# Altium schematic symbol library jlcpcb_2025_04_ferrites_extended_0603.schlib: 833 symbols (part 4 of 4) (continued)
## PB1608-600_3A0
designator FB?  Impedance @ Frequency: 60Ω@100MHz
Ferrite, 60Ω@100MHz, ±25%, 30mΩ, 3A, SMD 0603; Manufacturer: CEC(Shenzhen Zhenhua Fu Elec); Manufacturer Part Number: PB1608-600/3A0; Package Size: 0603; JLCPCB Basic Part: No; JLCPCB Part Number: C2983011; Supplier 1: LCSC; Category: Ferrite Beads; Supplier Part Number 1: C2983011; Tolerance: ±25%; Rated Current: 3A; DC Resistance: 30mΩ; RoHS: Yes; ComponentLink1Description: Datasheet; ComponentLink1URL: https://wmsc.lcsc.com/wmsc/upload/file/pdf/v2/lcsc/2203221830_CEC-Shenzhen-Zhenhua-Fu-Elec-PB1608-600-3A0_C2983011.pdf; ComponentLink2Description: JLCPCB Part URL; ComponentLink2URL: https://jlcpcb.com/partdetail/C2983011; ComponentLink3Description: LCSC Part URL; ComponentLink3URL: https://lcsc.com/product-detail/Ferrite-Beads_CECShenzhen-Zhenhua-Fu-Elec-CECShenzhen-Zhenhua-Fu-Elec-PB1608-600-3A0_C2983011.html
footprint FB-0603 (0603 (1608M) Ferrite)
pins: 1, 2

## PBY160808T-100Y-N
designator FB?  Impedance @ Frequency: 10Ω@100MHz
Ferrite, 10Ω@100MHz, ±25%, 0.02Ω, 4000mA, SMD 0603; Manufacturer: Chilisin Elec; Manufacturer Part Number: PBY160808T-100Y-N; Package Size: 0603; JLCPCB Basic Part: No; JLCPCB Part Number: C142081; Supplier 1: LCSC; Category: Ferrite Beads; Supplier Part Number 1: C142081; Tolerance: ±25%; Rated Current: 4000mA; DC Resistance: 0.02Ω; RoHS: Yes; ComponentLink1Description: Datasheet; ComponentLink1URL: https://wmsc.lcsc.com/wmsc/upload/file/pdf/v2/lcsc/2304140030_Chilisin-Elec-PBY160808T-100Y-N_C142081.pdf; ComponentLink2Description: JLCPCB Part URL; ComponentLink2URL: https://jlcpcb.com/partdetail/C142081; ComponentLink3Description: LCSC Part URL; ComponentLink3URL: https://lcsc.com/product-detail/Ferrite-Beads_Chilisin-Elec-Chilisin-Elec-PBY160808T-100Y-N_C142081.html
footprint FB-0603 (0603 (1608M) Ferrite)
pins: 1, 2

## PBY160808T-101Y-N
designator FB?  Impedance @ Frequency: 100Ω@100MHz
Ferrite, 100Ω@100MHz, ±25%, 0.05Ω, 2500mA, SMD 0603; Manufacturer: Chilisin Elec; Manufacturer Part Number: PBY160808T-101Y-N; Package Size: 0603; JLCPCB Basic Part: No; JLCPCB Part Number: C142080; Supplier 1: LCSC; Category: Ferrite Beads; Supplier Part Number 1: C142080; Tolerance: ±25%; Rated Current: 2500mA; DC Resistance: 0.05Ω; RoHS: Yes; ComponentLink1Description: Datasheet; ComponentLink1URL: https://wmsc.lcsc.com/wmsc/upload/file/pdf/v2/lcsc/2304140030_Chilisin-Elec-PBY160808T-101Y-N_C142080.pdf; ComponentLink2Description: JLCPCB Part URL; ComponentLink2URL: https://jlcpcb.com/partdetail/C142080; ComponentLink3Description: LCSC Part URL; ComponentLink3URL: https://lcsc.com/product-detail/Ferrite-Beads_Chilisin-Elec-Chilisin-Elec-PBY160808T-101Y-N_C142080.html
footprint FB-0603 (0603 (1608M) Ferrite)
pins: 1, 2

## PBY160808T-102Y-N
designator FB?  Impedance @ Frequency: 1000Ω@100MHz
Ferrite, 1000Ω@100MHz, ±25%, 0.25Ω, 800mA, SMD 0603; Manufacturer: Chilisin Elec; Manufacturer Part Number: PBY160808T-102Y-N; Package Size: 0603; JLCPCB Basic Part: No; JLCPCB Part Number: C142079; Supplier 1: LCSC; Category: Ferrite Beads; Supplier Part Number 1: C142079; Tolerance: ±25%; Rated Current: 800mA; DC Resistance: 0.25Ω; RoHS: Yes; ComponentLink1Description: Datasheet; ComponentLink1URL: https://wmsc.lcsc.com/wmsc/upload/file/pdf/v2/lcsc/2304140030_Chilisin-Elec-PBY160808T-102Y-N_C142079.pdf; ComponentLink2Description: JLCPCB Part URL; ComponentLink2URL: https://jlcpcb.com/partdetail/C142079; ComponentLink3Description: LCSC Part URL; ComponentLink3URL: https://lcsc.com/product-detail/Ferrite-Beads_Chilisin-Elec-Chilisin-Elec-PBY160808T-102Y-N_C142079.html
footprint FB-0603 (0603 (1608M) Ferrite)
pins: 1, 2

## PBY160808T-110Y-N
designator FB?  Impedance @ Frequency: 11Ω@100MHz
Ferrite, 11Ω@100MHz, ±25%, 0.02Ω, 4000mA, SMD 0603; Manufacturer: Chilisin Elec; Manufacturer Part Number: PBY160808T-110Y-N; Package Size: 0603; JLCPCB Basic Part: No; JLCPCB Part Number: C280672; Supplier 1: LCSC; Category: Ferrite Beads; Supplier Part Number 1: C280672; Tolerance: ±25%; Rated Current: 4000mA; DC Resistance: 0.02Ω; RoHS: Yes; ComponentLink1Description: Datasheet; ComponentLink1URL: https://wmsc.lcsc.com/wmsc/upload/file/pdf/v2/lcsc/2304140030_Chilisin-Elec-PBY160808T-110Y-N_C280672.pdf; ComponentLink2Description: JLCPCB Part URL; ComponentLink2URL: https://jlcpcb.com/partdetail/C280672; ComponentLink3Description: LCSC Part URL; ComponentLink3URL: https://lcsc.com/product-detail/Ferrite-Beads_Chilisin-Elec-Chilisin-Elec-PBY160808T-110Y-N_C280672.html
footprint FB-0603 (0603 (1608M) Ferrite)
pins: 1, 2

## PBY160808T-151Y-N
designator FB?  Impedance @ Frequency: 150Ω@100MHz
Ferrite, 150Ω@100MHz, ±25%, 0.085Ω, 2000mA, SMD 0603; Manufacturer: Chilisin Elec; Manufacturer Part Number: PBY160808T-151Y-N; Package Size: 0603; JLCPCB Basic Part: No; JLCPCB Part Number: C142078; Supplier 1: LCSC; Category: Ferrite Beads; Supplier Part Number 1: C142078; Tolerance: ±25%; Rated Current: 2000mA; DC Resistance: 0.085Ω; RoHS: Yes; ComponentLink1Description: Datasheet; ComponentLink1URL: https://wmsc.lcsc.com/wmsc/upload/file/pdf/v2/lcsc/2304140030_Chilisin-Elec-PBY160808T-151Y-N_C142078.pdf; ComponentLink2Description: JLCPCB Part URL; ComponentLink2URL: https://jlcpcb.com/partdetail/C142078; ComponentLink3Description: LCSC Part URL; ComponentLink3URL: https://lcsc.com/product-detail/Ferrite-Beads_Chilisin-Elec-Chilisin-Elec-PBY160808T-151Y-N_C142078.html
footprint FB-0603 (0603 (1608M) Ferrite)
pins: 1, 2

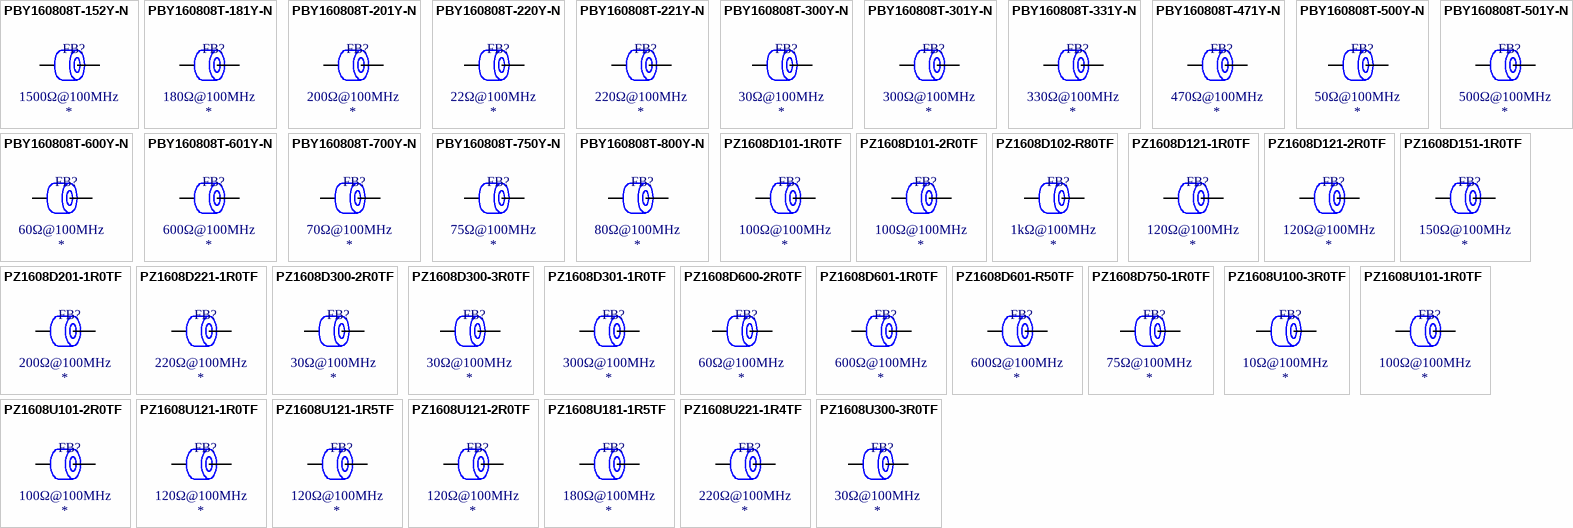
[diagram p17: symbols PBY160808T-152Y-N to PZ1608U300-3R0TF]

## PBY160808T-152Y-N
designator FB?  Impedance @ Frequency: 1500Ω@100MHz
Ferrite, 1500Ω@100MHz, ±25%, 0.4Ω, 500mA, SMD 0603; Manufacturer: Chilisin Elec; Manufacturer Part Number: PBY160808T-152Y-N; Package Size: 0603; JLCPCB Basic Part: No; JLCPCB Part Number: C142077; Supplier 1: LCSC; Category: Ferrite Beads; Supplier Part Number 1: C142077; Tolerance: ±25%; Rated Current: 500mA; DC Resistance: 0.4Ω; RoHS: Yes; ComponentLink1Description: Datasheet; ComponentLink1URL: https://wmsc.lcsc.com/wmsc/upload/file/pdf/v2/lcsc/2304140030_Chilisin-Elec-PBY160808T-152Y-N_C142077.pdf; ComponentLink2Description: JLCPCB Part URL; ComponentLink2URL: https://jlcpcb.com/partdetail/C142077; ComponentLink3Description: LCSC Part URL; ComponentLink3URL: https://lcsc.com/product-detail/Ferrite-Beads_Chilisin-Elec-Chilisin-Elec-PBY160808T-152Y-N_C142077.html
footprint FB-0603 (0603 (1608M) Ferrite)
pins: 1, 2

## PBY160808T-181Y-N
designator FB?  Impedance @ Frequency: 180Ω@100MHz
Ferrite, 180Ω@100MHz, ±25%, 0.09Ω, 2000mA, SMD 0603; Manufacturer: Chilisin Elec; Manufacturer Part Number: PBY160808T-181Y-N; Package Size: 0603; JLCPCB Basic Part: No; JLCPCB Part Number: C114288; Supplier 1: LCSC; Category: Ferrite Beads; Supplier Part Number 1: C114288; Tolerance: ±25%; Rated Current: 2000mA; DC Resistance: 0.09Ω; RoHS: Yes; ComponentLink1Description: Datasheet; ComponentLink1URL: https://wmsc.lcsc.com/wmsc/upload/file/pdf/v2/lcsc/2304140030_Chilisin-Elec-PBY160808T-181Y-N_C114288.pdf; ComponentLink2Description: JLCPCB Part URL; ComponentLink2URL: https://jlcpcb.com/partdetail/C114288; ComponentLink3Description: LCSC Part URL; ComponentLink3URL: https://lcsc.com/product-detail/Ferrite-Beads_Chilisin-Elec-Chilisin-Elec-PBY160808T-181Y-N_C114288.html
footprint FB-0603 (0603 (1608M) Ferrite)
pins: 1, 2

## PBY160808T-201Y-N
designator FB?  Impedance @ Frequency: 200Ω@100MHz
Ferrite, 200Ω@100MHz, ±25%, SMD 0603; Manufacturer: Chilisin Elec; Manufacturer Part Number: PBY160808T-201Y-N; Package Size: 0603; JLCPCB Basic Part: No; JLCPCB Part Number: C142076; Supplier 1: LCSC; Category: Ferrite Beads; Supplier Part Number 1: C142076; Tolerance: ±25%; RoHS: Yes; ComponentLink1Description: Datasheet; ComponentLink1URL: https://wmsc.lcsc.com/wmsc/upload/file/pdf/v2/lcsc/2304140030_Chilisin-Elec-PBY160808T-201Y-N_C142076.pdf; ComponentLink2Description: JLCPCB Part URL; ComponentLink2URL: https://jlcpcb.com/partdetail/C142076; ComponentLink3Description: LCSC Part URL; ComponentLink3URL: https://lcsc.com/product-detail/Ferrite-Beads_Chilisin-Elec-Chilisin-Elec-PBY160808T-201Y-N_C142076.html
pins: 1, 2

## PBY160808T-220Y-N
designator FB?  Impedance @ Frequency: 22Ω@100MHz
Ferrite, 22Ω@100MHz, ±25%, SMD 0603; Manufacturer: Chilisin Elec; Manufacturer Part Number: PBY160808T-220Y-N; Package Size: 0603; JLCPCB Basic Part: No; JLCPCB Part Number: C365833; Supplier 1: LCSC; Category: Ferrite Beads; Supplier Part Number 1: C365833; Tolerance: ±25%; RoHS: Yes; ComponentLink1Description: Datasheet; ComponentLink1URL: https://wmsc.lcsc.com/wmsc/upload/file/pdf/v2/lcsc/2304140030_Chilisin-Elec-PBY160808T-220Y-N_C365833.pdf; ComponentLink2Description: JLCPCB Part URL; ComponentLink2URL: https://jlcpcb.com/partdetail/C365833; ComponentLink3Description: LCSC Part URL; ComponentLink3URL: https://lcsc.com/product-detail/Ferrite-Beads_Chilisin-Elec-Chilisin-Elec-PBY160808T-220Y-N_C365833.html
pins: 1, 2

## PBY160808T-221Y-N
designator FB?  Impedance @ Frequency: 220Ω@100MHz
Ferrite, 220Ω@100MHz, ±25%, 0.1Ω, 2000mA, SMD 0603; Manufacturer: Chilisin Elec; Manufacturer Part Number: PBY160808T-221Y-N; Package Size: 0603; JLCPCB Basic Part: No; JLCPCB Part Number: C108299; Supplier 1: LCSC; Category: Ferrite Beads; Supplier Part Number 1: C108299; Tolerance: ±25%; Rated Current: 2000mA; DC Resistance: 0.1Ω; RoHS: Yes; ComponentLink1Description: Datasheet; ComponentLink1URL: https://wmsc.lcsc.com/wmsc/upload/file/pdf/v2/lcsc/2304140030_Chilisin-Elec-PBY160808T-221Y-N_C108299.pdf; ComponentLink2Description: JLCPCB Part URL; ComponentLink2URL: https://jlcpcb.com/partdetail/C108299; ComponentLink3Description: LCSC Part URL; ComponentLink3URL: https://lcsc.com/product-detail/Ferrite-Beads_Chilisin-Elec-Chilisin-Elec-PBY160808T-221Y-N_C108299.html
footprint FB-0603 (0603 (1608M) Ferrite)
pins: 1, 2

## PBY160808T-300Y-N
designator FB?  Impedance @ Frequency: 30Ω@100MHz
Ferrite, 30Ω@100MHz, ±25%, 0.03Ω, 3000mA, SMD 0603; Manufacturer: Chilisin Elec; Manufacturer Part Number: PBY160808T-300Y-N; Package Size: 0603; JLCPCB Basic Part: No; JLCPCB Part Number: C142075; Supplier 1: LCSC; Category: Ferrite Beads; Supplier Part Number 1: C142075; Tolerance: ±25%; Rated Current: 3000mA; DC Resistance: 0.03Ω; RoHS: Yes; ComponentLink1Description: Datasheet; ComponentLink1URL: https://wmsc.lcsc.com/wmsc/upload/file/pdf/v2/lcsc/2304140030_Chilisin-Elec-PBY160808T-300Y-N_C142075.pdf; ComponentLink2Description: JLCPCB Part URL; ComponentLink2URL: https://jlcpcb.com/partdetail/C142075; ComponentLink3Description: LCSC Part URL; ComponentLink3URL: https://lcsc.com/product-detail/Ferrite-Beads_Chilisin-Elec-Chilisin-Elec-PBY160808T-300Y-N_C142075.html
footprint FB-0603 (0603 (1608M) Ferrite)
pins: 1, 2

## PBY160808T-301Y-N
designator FB?  Impedance @ Frequency: 300Ω@100MHz
Ferrite, 300Ω@100MHz, ±25%, 0.12Ω, 1500mA, SMD 0603; Manufacturer: Chilisin Elec; Manufacturer Part Number: PBY160808T-301Y-N; Package Size: 0603; JLCPCB Basic Part: No; JLCPCB Part Number: C108300; Supplier 1: LCSC; Category: Ferrite Beads; Supplier Part Number 1: C108300; Tolerance: ±25%; Rated Current: 1500mA; DC Resistance: 0.12Ω; RoHS: Yes; ComponentLink1Description: Datasheet; ComponentLink1URL: https://wmsc.lcsc.com/wmsc/upload/file/pdf/v2/lcsc/2304140030_Chilisin-Elec-PBY160808T-301Y-N_C108300.pdf; ComponentLink2Description: JLCPCB Part URL; ComponentLink2URL: https://jlcpcb.com/partdetail/C108300; ComponentLink3Description: LCSC Part URL; ComponentLink3URL: https://lcsc.com/product-detail/Ferrite-Beads_Chilisin-Elec-Chilisin-Elec-PBY160808T-301Y-N_C108300.html
footprint FB-0603 (0603 (1608M) Ferrite)
pins: 1, 2

## PBY160808T-331Y-N
designator FB?  Impedance @ Frequency: 330Ω@100MHz
Ferrite, 330Ω@100MHz, ±25%, 0.12Ω, 1500mA, SMD 0603; Manufacturer: Chilisin Elec; Manufacturer Part Number: PBY160808T-331Y-N; Package Size: 0603; JLCPCB Basic Part: No; JLCPCB Part Number: C142074; Supplier 1: LCSC; Category: Ferrite Beads; Supplier Part Number 1: C142074; Tolerance: ±25%; Rated Current: 1500mA; DC Resistance: 0.12Ω; RoHS: Yes; ComponentLink1Description: Datasheet; ComponentLink1URL: https://wmsc.lcsc.com/wmsc/upload/file/pdf/v2/lcsc/2304140030_Chilisin-Elec-PBY160808T-331Y-N_C142074.pdf; ComponentLink2Description: JLCPCB Part URL; ComponentLink2URL: https://jlcpcb.com/partdetail/C142074; ComponentLink3Description: LCSC Part URL; ComponentLink3URL: https://lcsc.com/product-detail/Ferrite-Beads_Chilisin-Elec-Chilisin-Elec-PBY160808T-331Y-N_C142074.html
footprint FB-0603 (0603 (1608M) Ferrite)
pins: 1, 2

## PBY160808T-471Y-N
designator FB?  Impedance @ Frequency: 470Ω@100MHz
Ferrite, 470Ω@100MHz, ±25%, 0.15Ω, 1500mA, SMD 0603; Manufacturer: Chilisin Elec; Manufacturer Part Number: PBY160808T-471Y-N; Package Size: 0603; JLCPCB Basic Part: No; JLCPCB Part Number: C142072; Supplier 1: LCSC; Category: Ferrite Beads; Supplier Part Number 1: C142072; Tolerance: ±25%; Rated Current: 1500mA; DC Resistance: 0.15Ω; RoHS: Yes; ComponentLink1Description: Datasheet; ComponentLink1URL: https://wmsc.lcsc.com/wmsc/upload/file/pdf/v2/lcsc/2304140030_Chilisin-Elec-PBY160808T-471Y-N_C142072.pdf; ComponentLink2Description: JLCPCB Part URL; ComponentLink2URL: https://jlcpcb.com/partdetail/C142072; ComponentLink3Description: LCSC Part URL; ComponentLink3URL: https://lcsc.com/product-detail/Ferrite-Beads_Chilisin-Elec-Chilisin-Elec-PBY160808T-471Y-N_C142072.html
footprint FB-0603 (0603 (1608M) Ferrite)
pins: 1, 2

## PBY160808T-500Y-N
designator FB?  Impedance @ Frequency: 50Ω@100MHz
Ferrite, 50Ω@100MHz, ±25%, SMD 0603; Manufacturer: Chilisin Elec; Manufacturer Part Number: PBY160808T-500Y-N; Package Size: 0603; JLCPCB Basic Part: No; JLCPCB Part Number: C142071; Supplier 1: LCSC; Category: Ferrite Beads; Supplier Part Number 1: C142071; Tolerance: ±25%; RoHS: Yes; ComponentLink1Description: Datasheet; ComponentLink1URL: https://wmsc.lcsc.com/wmsc/upload/file/pdf/v2/lcsc/2304140030_Chilisin-Elec-PBY160808T-500Y-N_C142071.pdf; ComponentLink2Description: JLCPCB Part URL; ComponentLink2URL: https://jlcpcb.com/partdetail/C142071; ComponentLink3Description: LCSC Part URL; ComponentLink3URL: https://lcsc.com/product-detail/Ferrite-Beads_Chilisin-Elec-Chilisin-Elec-PBY160808T-500Y-N_C142071.html
pins: 1, 2

## PBY160808T-501Y-N
designator FB?  Impedance @ Frequency: 500Ω@100MHz
Ferrite, 500Ω@100MHz, ±25%, SMD 0603; Manufacturer: Chilisin Elec; Manufacturer Part Number: PBY160808T-501Y-N; Package Size: 0603; JLCPCB Basic Part: No; JLCPCB Part Number: C142070; Supplier 1: LCSC; Category: Ferrite Beads; Supplier Part Number 1: C142070; Tolerance: ±25%; RoHS: Yes; ComponentLink1Description: Datasheet; ComponentLink1URL: https://wmsc.lcsc.com/wmsc/upload/file/pdf/v2/lcsc/2304140030_Chilisin-Elec-PBY160808T-501Y-N_C142070.pdf; ComponentLink2Description: JLCPCB Part URL; ComponentLink2URL: https://jlcpcb.com/partdetail/C142070; ComponentLink3Description: LCSC Part URL; ComponentLink3URL: https://lcsc.com/product-detail/Ferrite-Beads_Chilisin-Elec-Chilisin-Elec-PBY160808T-501Y-N_C142070.html
pins: 1, 2

## PBY160808T-600Y-N
designator FB?  Impedance @ Frequency: 60Ω@100MHz
Ferrite, 60Ω@100MHz, ±25%, 0.04Ω, 3000mA, SMD 0603; Manufacturer: Chilisin Elec; Manufacturer Part Number: PBY160808T-600Y-N; Package Size: 0603; JLCPCB Basic Part: No; JLCPCB Part Number: C142069; Supplier 1: LCSC; Category: Ferrite Beads; Supplier Part Number 1: C142069; Tolerance: ±25%; Rated Current: 3000mA; DC Resistance: 0.04Ω; RoHS: Yes; ComponentLink1Description: Datasheet; ComponentLink1URL: https://wmsc.lcsc.com/wmsc/upload/file/pdf/v2/lcsc/2304140030_Chilisin-Elec-PBY160808T-600Y-N_C142069.pdf; ComponentLink2Description: JLCPCB Part URL; ComponentLink2URL: https://jlcpcb.com/partdetail/C142069; ComponentLink3Description: LCSC Part URL; ComponentLink3URL: https://lcsc.com/product-detail/Ferrite-Beads_Chilisin-Elec-Chilisin-Elec-PBY160808T-600Y-N_C142069.html
footprint FB-0603 (0603 (1608M) Ferrite)
pins: 1, 2

## PBY160808T-601Y-N
designator FB?  Impedance @ Frequency: 600Ω@100MHz
Ferrite, 600Ω@100MHz, ±25%, 0.2Ω, 1000mA, SMD 0603; Manufacturer: Chilisin Elec; Manufacturer Part Number: PBY160808T-601Y-N; Package Size: 0603; JLCPCB Basic Part: No; JLCPCB Part Number: C108301; Supplier 1: LCSC; Category: Ferrite Beads; Supplier Part Number 1: C108301; Tolerance: ±25%; Rated Current: 1000mA; DC Resistance: 0.2Ω; RoHS: Yes; ComponentLink1Description: Datasheet; ComponentLink1URL: https://wmsc.lcsc.com/wmsc/upload/file/pdf/v2/lcsc/2304140030_Chilisin-Elec-PBY160808T-601Y-N_C108301.pdf; ComponentLink2Description: JLCPCB Part URL; ComponentLink2URL: https://jlcpcb.com/partdetail/C108301; ComponentLink3Description: LCSC Part URL; ComponentLink3URL: https://lcsc.com/product-detail/Ferrite-Beads_Chilisin-Elec-Chilisin-Elec-PBY160808T-601Y-N_C108301.html
footprint FB-0603 (0603 (1608M) Ferrite)
pins: 1, 2

## PBY160808T-700Y-N
designator FB?  Impedance @ Frequency: 70Ω@100MHz
Ferrite, 70Ω@100MHz, ±25%, SMD 0603; Manufacturer: Chilisin Elec; Manufacturer Part Number: PBY160808T-700Y-N; Package Size: 0603; JLCPCB Basic Part: No; JLCPCB Part Number: C142068; Supplier 1: LCSC; Category: Ferrite Beads; Supplier Part Number 1: C142068; Tolerance: ±25%; RoHS: Yes; ComponentLink1Description: Datasheet; ComponentLink1URL: https://wmsc.lcsc.com/wmsc/upload/file/pdf/v2/lcsc/2304140030_Chilisin-Elec-PBY160808T-700Y-N_C142068.pdf; ComponentLink2Description: JLCPCB Part URL; ComponentLink2URL: https://jlcpcb.com/partdetail/C142068; ComponentLink3Description: LCSC Part URL; ComponentLink3URL: https://lcsc.com/product-detail/Ferrite-Beads_Chilisin-Elec-Chilisin-Elec-PBY160808T-700Y-N_C142068.html
pins: 1, 2

## PBY160808T-750Y-N
designator FB?  Impedance @ Frequency: 75Ω@100MHz
Ferrite, 75Ω@100MHz, ±25%, SMD 0603; Manufacturer: Chilisin Elec; Manufacturer Part Number: PBY160808T-750Y-N; Package Size: 0603; JLCPCB Basic Part: No; JLCPCB Part Number: C142067; Supplier 1: LCSC; Category: Ferrite Beads; Supplier Part Number 1: C142067; Tolerance: ±25%; RoHS: Yes; ComponentLink1Description: Datasheet; ComponentLink1URL: https://wmsc.lcsc.com/wmsc/upload/file/pdf/v2/lcsc/2304140030_Chilisin-Elec-PBY160808T-750Y-N_C142067.pdf; ComponentLink2Description: JLCPCB Part URL; ComponentLink2URL: https://jlcpcb.com/partdetail/C142067; ComponentLink3Description: LCSC Part URL; ComponentLink3URL: https://lcsc.com/product-detail/Ferrite-Beads_Chilisin-Elec-Chilisin-Elec-PBY160808T-750Y-N_C142067.html
pins: 1, 2

## PBY160808T-800Y-N
designator FB?  Impedance @ Frequency: 80Ω@100MHz
Ferrite, 80Ω@100MHz, ±25%, 0.05Ω, 2500mA, SMD 0603; Manufacturer: Chilisin Elec; Manufacturer Part Number: PBY160808T-800Y-N; Package Size: 0603; JLCPCB Basic Part: No; JLCPCB Part Number: C108302; Supplier 1: LCSC; Category: Ferrite Beads; Supplier Part Number 1: C108302; Tolerance: ±25%; Rated Current: 2500mA; DC Resistance: 0.05Ω; RoHS: Yes; ComponentLink1Description: Datasheet; ComponentLink1URL: https://wmsc.lcsc.com/wmsc/upload/file/pdf/v2/lcsc/2304140030_Chilisin-Elec-PBY160808T-800Y-N_C108302.pdf; ComponentLink2Description: JLCPCB Part URL; ComponentLink2URL: https://jlcpcb.com/partdetail/C108302; ComponentLink3Description: LCSC Part URL; ComponentLink3URL: https://lcsc.com/product-detail/Ferrite-Beads_Chilisin-Elec-Chilisin-Elec-PBY160808T-800Y-N_C108302.html
footprint FB-0603 (0603 (1608M) Ferrite)
pins: 1, 2

## PZ1608D101-1R0TF
designator FB?  Impedance @ Frequency: 100Ω@100MHz
Ferrite, 100Ω@100MHz, ±25%, 1A, SMD 0603; Manufacturer: Sunlord; Manufacturer Part Number: PZ1608D101-1R0TF; Package Size: 0603; JLCPCB Basic Part: No; JLCPCB Part Number: C370057; Supplier 1: LCSC; Category: Ferrite Beads; Supplier Part Number 1: C370057; Tolerance: ±25%; Rated Current: 1A; RoHS: Yes; ComponentLink1Description: Datasheet; ComponentLink1URL: https://wmsc.lcsc.com/wmsc/upload/file/pdf/v2/lcsc/2310301641_Sunlord-PZ1608D101-1R0TF_C370057.pdf; ComponentLink2Description: JLCPCB Part URL; ComponentLink2URL: https://jlcpcb.com/partdetail/C370057; ComponentLink3Description: LCSC Part URL; ComponentLink3URL: https://lcsc.com/product-detail/Ferrite-Beads_Sunlord-Sunlord-PZ1608D101-1R0TF_C370057.html
pins: 1, 2

## PZ1608D101-2R0TF
designator FB?  Impedance @ Frequency: 100Ω@100MHz
Ferrite, 100Ω@100MHz, ±25%, 2A, SMD 0603; Manufacturer: Sunlord; Manufacturer Part Number: PZ1608D101-2R0TF; Package Size: 0603; JLCPCB Basic Part: No; JLCPCB Part Number: C370058; Supplier 1: LCSC; Category: Ferrite Beads; Supplier Part Number 1: C370058; Tolerance: ±25%; Rated Current: 2A; RoHS: Yes; ComponentLink1Description: Datasheet; ComponentLink1URL: https://wmsc.lcsc.com/wmsc/upload/file/pdf/v2/lcsc/2310301641_Sunlord-PZ1608D101-2R0TF_C370058.pdf; ComponentLink2Description: JLCPCB Part URL; ComponentLink2URL: https://jlcpcb.com/partdetail/C370058; ComponentLink3Description: LCSC Part URL; ComponentLink3URL: https://lcsc.com/product-detail/Ferrite-Beads_Sunlord-Sunlord-PZ1608D101-2R0TF_C370058.html
pins: 1, 2

## PZ1608D102-R80TF
designator FB?  Impedance @ Frequency: 1kΩ@100MHz
Ferrite, 1kΩ@100MHz, ±25%, 0.8A, SMD 0603; Manufacturer: Sunlord; Manufacturer Part Number: PZ1608D102-R80TF; Package Size: 0603; JLCPCB Basic Part: No; JLCPCB Part Number: C279752; Supplier 1: LCSC; Category: Ferrite Beads; Supplier Part Number 1: C279752; Tolerance: ±25%; Rated Current: 0.8A; RoHS: Yes; ComponentLink1Description: Datasheet; ComponentLink1URL: https://wmsc.lcsc.com/wmsc/upload/file/pdf/v2/lcsc/2310301641_Sunlord-PZ1608D102-R80TF_C279752.pdf; ComponentLink2Description: JLCPCB Part URL; ComponentLink2URL: https://jlcpcb.com/partdetail/C279752; ComponentLink3Description: LCSC Part URL; ComponentLink3URL: https://lcsc.com/product-detail/Ferrite-Beads_Sunlord-Sunlord-PZ1608D102-R80TF_C279752.html
pins: 1, 2

## PZ1608D121-1R0TF
designator FB?  Impedance @ Frequency: 120Ω@100MHz
Ferrite, 120Ω@100MHz, ±25%, 0.2Ω, 1000mA, SMD 0603; Manufacturer: Sunlord; Manufacturer Part Number: PZ1608D121-1R0TF; Package Size: 0603; JLCPCB Basic Part: No; JLCPCB Part Number: C98285; Supplier 1: LCSC; Category: Ferrite Beads; Supplier Part Number 1: C98285; Tolerance: ±25%; Rated Current: 1000mA; DC Resistance: 0.2Ω; RoHS: Yes; ComponentLink1Description: Datasheet; ComponentLink1URL: https://wmsc.lcsc.com/wmsc/upload/file/pdf/v2/lcsc/2310301641_Sunlord-PZ1608D121-1R0TF_C98285.pdf; ComponentLink2Description: JLCPCB Part URL; ComponentLink2URL: https://jlcpcb.com/partdetail/C98285; ComponentLink3Description: LCSC Part URL; ComponentLink3URL: https://lcsc.com/product-detail/Ferrite-Beads_Sunlord-Sunlord-PZ1608D121-1R0TF_C98285.html
footprint FB-0603 (0603 (1608M) Ferrite)
pins: 1, 2

## PZ1608D121-2R0TF
designator FB?  Impedance @ Frequency: 120Ω@100MHz
Ferrite, 120Ω@100MHz, ±25%, 2A, SMD 0603; Manufacturer: Sunlord; Manufacturer Part Number: PZ1608D121-2R0TF; Package Size: 0603; JLCPCB Basic Part: No; JLCPCB Part Number: C42102; Supplier 1: LCSC; Category: Ferrite Beads; Supplier Part Number 1: C42102; Tolerance: ±25%; Rated Current: 2A; RoHS: Yes; ComponentLink1Description: Datasheet; ComponentLink1URL: https://wmsc.lcsc.com/wmsc/upload/file/pdf/v2/lcsc/2310301641_Sunlord-PZ1608D121-2R0TF_C42102.pdf; ComponentLink2Description: JLCPCB Part URL; ComponentLink2URL: https://jlcpcb.com/partdetail/C42102; ComponentLink3Description: LCSC Part URL; ComponentLink3URL: https://lcsc.com/product-detail/Ferrite-Beads_Sunlord-Sunlord-PZ1608D121-2R0TF_C42102.html
pins: 1, 2

## PZ1608D151-1R0TF
designator FB?  Impedance @ Frequency: 150Ω@100MHz
Ferrite, 150Ω@100MHz, ±25%, 1A, SMD 0603; Manufacturer: Sunlord; Manufacturer Part Number: PZ1608D151-1R0TF; Package Size: 0603; JLCPCB Basic Part: No; JLCPCB Part Number: C370059; Supplier 1: LCSC; Category: Ferrite Beads; Supplier Part Number 1: C370059; Tolerance: ±25%; Rated Current: 1A; RoHS: Yes; ComponentLink1Description: Datasheet; ComponentLink1URL: https://wmsc.lcsc.com/wmsc/upload/file/pdf/v2/lcsc/2310301641_Sunlord-PZ1608D151-1R0TF_C370059.pdf; ComponentLink2Description: JLCPCB Part URL; ComponentLink2URL: https://jlcpcb.com/partdetail/C370059; ComponentLink3Description: LCSC Part URL; ComponentLink3URL: https://lcsc.com/product-detail/Ferrite-Beads_Sunlord-Sunlord-PZ1608D151-1R0TF_C370059.html
pins: 1, 2

## PZ1608D201-1R0TF
designator FB?  Impedance @ Frequency: 200Ω@100MHz
Ferrite, 200Ω@100MHz, ±25%, 1A, SMD 0603; Manufacturer: Sunlord; Manufacturer Part Number: PZ1608D201-1R0TF; Package Size: 0603; JLCPCB Basic Part: No; JLCPCB Part Number: C370060; Supplier 1: LCSC; Category: Ferrite Beads; Supplier Part Number 1: C370060; Tolerance: ±25%; Rated Current: 1A; RoHS: Yes; ComponentLink1Description: Datasheet; ComponentLink1URL: https://wmsc.lcsc.com/wmsc/upload/file/pdf/v2/lcsc/2310301641_Sunlord-PZ1608D201-1R0TF_C370060.pdf; ComponentLink2Description: JLCPCB Part URL; ComponentLink2URL: https://jlcpcb.com/partdetail/C370060; ComponentLink3Description: LCSC Part URL; ComponentLink3URL: https://lcsc.com/product-detail/Ferrite-Beads_Sunlord-Sunlord-PZ1608D201-1R0TF_C370060.html
pins: 1, 2

## PZ1608D221-1R0TF
designator FB?  Impedance @ Frequency: 220Ω@100MHz
Ferrite, 220Ω@100MHz, ±25%, 0.2Ω, 1000mA, SMD 0603; Manufacturer: Sunlord; Manufacturer Part Number: PZ1608D221-1R0TF; Package Size: 0603; JLCPCB Basic Part: No; JLCPCB Part Number: C98286; Supplier 1: LCSC; Category: Ferrite Beads; Supplier Part Number 1: C98286; Tolerance: ±25%; Rated Current: 1000mA; DC Resistance: 0.2Ω; RoHS: Yes; ComponentLink1Description: Datasheet; ComponentLink1URL: https://wmsc.lcsc.com/wmsc/upload/file/pdf/v2/lcsc/2310301641_Sunlord-PZ1608D221-1R0TF_C98286.pdf; ComponentLink2Description: JLCPCB Part URL; ComponentLink2URL: https://jlcpcb.com/partdetail/C98286; ComponentLink3Description: LCSC Part URL; ComponentLink3URL: https://lcsc.com/product-detail/Ferrite-Beads_Sunlord-Sunlord-PZ1608D221-1R0TF_C98286.html
footprint FB-0603 (0603 (1608M) Ferrite)
pins: 1, 2

## PZ1608D300-2R0TF
designator FB?  Impedance @ Frequency: 30Ω@100MHz
Ferrite, 30Ω@100MHz, ±25%, 1A, SMD 0603; Manufacturer: Sunlord; Manufacturer Part Number: PZ1608D300-2R0TF; Package Size: 0603; JLCPCB Basic Part: No; JLCPCB Part Number: C370062; Supplier 1: LCSC; Category: Ferrite Beads; Supplier Part Number 1: C370062; Tolerance: ±25%; Rated Current: 1A; RoHS: Yes; ComponentLink1Description: Datasheet; ComponentLink1URL: https://wmsc.lcsc.com/wmsc/upload/file/pdf/v2/lcsc/2310301641_Sunlord-PZ1608D300-2R0TF_C370062.pdf; ComponentLink2Description: JLCPCB Part URL; ComponentLink2URL: https://jlcpcb.com/partdetail/C370062; ComponentLink3Description: LCSC Part URL; ComponentLink3URL: https://lcsc.com/product-detail/Ferrite-Beads_Sunlord-Sunlord-PZ1608D300-2R0TF_C370062.html
pins: 1, 2

## PZ1608D300-3R0TF
designator FB?  Impedance @ Frequency: 30Ω@100MHz
Ferrite, 30Ω@100MHz, ±25%, 0.03Ω, 3000mA, SMD 0603; Manufacturer: Sunlord; Manufacturer Part Number: PZ1608D300-3R0TF; Package Size: 0603; JLCPCB Basic Part: No; JLCPCB Part Number: C145059; Supplier 1: LCSC; Category: Ferrite Beads; Supplier Part Number 1: C145059; Tolerance: ±25%; Rated Current: 3000mA; DC Resistance: 0.03Ω; RoHS: Yes; ComponentLink1Description: Datasheet; ComponentLink1URL: https://wmsc.lcsc.com/wmsc/upload/file/pdf/v2/lcsc/2310301641_Sunlord-PZ1608D300-3R0TF_C145059.pdf; ComponentLink2Description: JLCPCB Part URL; ComponentLink2URL: https://jlcpcb.com/partdetail/C145059; ComponentLink3Description: LCSC Part URL; ComponentLink3URL: https://lcsc.com/product-detail/Ferrite-Beads_Sunlord-Sunlord-PZ1608D300-3R0TF_C145059.html
footprint FB-0603 (0603 (1608M) Ferrite)
pins: 1, 2

## PZ1608D301-1R0TF
designator FB?  Impedance @ Frequency: 300Ω@100MHz
Ferrite, 300Ω@100MHz, ±25%, 1A, SMD 0603; Manufacturer: Sunlord; Manufacturer Part Number: PZ1608D301-1R0TF; Package Size: 0603; JLCPCB Basic Part: No; JLCPCB Part Number: C370063; Supplier 1: LCSC; Category: Ferrite Beads; Supplier Part Number 1: C370063; Tolerance: ±25%; Rated Current: 1A; RoHS: Yes; ComponentLink1Description: Datasheet; ComponentLink1URL: https://wmsc.lcsc.com/wmsc/upload/file/pdf/v2/lcsc/2310301641_Sunlord-PZ1608D301-1R0TF_C370063.pdf; ComponentLink2Description: JLCPCB Part URL; ComponentLink2URL: https://jlcpcb.com/partdetail/C370063; ComponentLink3Description: LCSC Part URL; ComponentLink3URL: https://lcsc.com/product-detail/Ferrite-Beads_Sunlord-Sunlord-PZ1608D301-1R0TF_C370063.html
pins: 1, 2

## PZ1608D600-2R0TF
designator FB?  Impedance @ Frequency: 60Ω@100MHz
Ferrite, 60Ω@100MHz, ±25%, 0.08Ω, 2000mA, SMD 0603; Manufacturer: Sunlord; Manufacturer Part Number: PZ1608D600-2R0TF; Package Size: 0603; JLCPCB Basic Part: No; JLCPCB Part Number: C96726; Supplier 1: LCSC; Category: Ferrite Beads; Supplier Part Number 1: C96726; Tolerance: ±25%; Rated Current: 2000mA; DC Resistance: 0.08Ω; RoHS: Yes; ComponentLink1Description: Datasheet; ComponentLink1URL: https://wmsc.lcsc.com/wmsc/upload/file/pdf/v2/lcsc/2310301641_Sunlord-PZ1608D600-2R0TF_C96726.pdf; ComponentLink2Description: JLCPCB Part URL; ComponentLink2URL: https://jlcpcb.com/partdetail/C96726; ComponentLink3Description: LCSC Part URL; ComponentLink3URL: https://lcsc.com/product-detail/Ferrite-Beads_Sunlord-Sunlord-PZ1608D600-2R0TF_C96726.html
footprint FB-0603 (0603 (1608M) Ferrite)
pins: 1, 2

## PZ1608D601-1R0TF
designator FB?  Impedance @ Frequency: 600Ω@100MHz
Ferrite, 600Ω@100MHz, ±25%, 1A, SMD 0603; Manufacturer: Sunlord; Manufacturer Part Number: PZ1608D601-1R0TF; Package Size: 0603; JLCPCB Basic Part: No; JLCPCB Part Number: C279870; Supplier 1: LCSC; Category: Ferrite Beads; Supplier Part Number 1: C279870; Tolerance: ±25%; Rated Current: 1A; RoHS: Yes; ComponentLink1Description: Datasheet; ComponentLink1URL: https://wmsc.lcsc.com/wmsc/upload/file/pdf/v2/lcsc/2310301641_Sunlord-PZ1608D601-1R0TF_C279870.pdf; ComponentLink2Description: JLCPCB Part URL; ComponentLink2URL: https://jlcpcb.com/partdetail/C279870; ComponentLink3Description: LCSC Part URL; ComponentLink3URL: https://lcsc.com/product-detail/Ferrite-Beads_Sunlord-Sunlord-PZ1608D601-1R0TF_C279870.html
pins: 1, 2

## PZ1608D601-R50TF
designator FB?  Impedance @ Frequency: 600Ω@100MHz
Ferrite, 600Ω@100MHz, ±25%, 0.35Ω, 500mA, SMD 0603; Manufacturer: Sunlord; Manufacturer Part Number: PZ1608D601-R50TF; Package Size: 0603; JLCPCB Basic Part: No; JLCPCB Part Number: C98287; Supplier 1: LCSC; Category: Ferrite Beads; Supplier Part Number 1: C98287; Tolerance: ±25%; Rated Current: 500mA; DC Resistance: 0.35Ω; RoHS: Yes; ComponentLink1Description: Datasheet; ComponentLink1URL: https://wmsc.lcsc.com/wmsc/upload/file/pdf/v2/lcsc/2310301641_Sunlord-PZ1608D601-R50TF_C98287.pdf; ComponentLink2Description: JLCPCB Part URL; ComponentLink2URL: https://jlcpcb.com/partdetail/C98287; ComponentLink3Description: LCSC Part URL; ComponentLink3URL: https://lcsc.com/product-detail/Ferrite-Beads_Sunlord-Sunlord-PZ1608D601-R50TF_C98287.html
footprint FB-0603 (0603 (1608M) Ferrite)
pins: 1, 2

## PZ1608D750-1R0TF
designator FB?  Impedance @ Frequency: 75Ω@100MHz
Ferrite, 75Ω@100MHz, ±25%, 0.15Ω, 1000mA, SMD 0603; Manufacturer: Sunlord; Manufacturer Part Number: PZ1608D750-1R0TF; Package Size: 0603; JLCPCB Basic Part: No; JLCPCB Part Number: C96727; Supplier 1: LCSC; Category: Ferrite Beads; Supplier Part Number 1: C96727; Tolerance: ±25%; Rated Current: 1000mA; DC Resistance: 0.15Ω; RoHS: Yes; ComponentLink1Description: Datasheet; ComponentLink1URL: https://wmsc.lcsc.com/wmsc/upload/file/pdf/v2/lcsc/2310301641_Sunlord-PZ1608D750-1R0TF_C96727.pdf; ComponentLink2Description: JLCPCB Part URL; ComponentLink2URL: https://jlcpcb.com/partdetail/C96727; ComponentLink3Description: LCSC Part URL; ComponentLink3URL: https://lcsc.com/product-detail/Ferrite-Beads_Sunlord-Sunlord-PZ1608D750-1R0TF_C96727.html
footprint FB-0603 (0603 (1608M) Ferrite)
pins: 1, 2

## PZ1608U100-3R0TF
designator FB?  Impedance @ Frequency: 10Ω@100MHz
Ferrite, 10Ω@100MHz, 0.02Ω, 3000mA, SMD 0603; Manufacturer: Sunlord; Manufacturer Part Number: PZ1608U100-3R0TF; Package Size: 0603; JLCPCB Basic Part: No; JLCPCB Part Number: C304463; Supplier 1: LCSC; Category: Ferrite Beads; Supplier Part Number 1: C304463; Rated Current: 3000mA; DC Resistance: 0.02Ω; RoHS: Yes; ComponentLink1Description: Datasheet; ComponentLink1URL: https://wmsc.lcsc.com/wmsc/upload/file/pdf/v2/lcsc/2310301641_Sunlord-PZ1608U100-3R0TF_C304463.pdf; ComponentLink2Description: JLCPCB Part URL; ComponentLink2URL: https://jlcpcb.com/partdetail/C304463; ComponentLink3Description: LCSC Part URL; ComponentLink3URL: https://lcsc.com/product-detail/Ferrite-Beads_Sunlord-Sunlord-PZ1608U100-3R0TF_C304463.html
pins: 1, 2

## PZ1608U101-1R0TF
designator FB?  Impedance @ Frequency: 100Ω@100MHz
Ferrite, 100Ω@100MHz, ±25%, 1A, SMD 0603; Manufacturer: Sunlord; Manufacturer Part Number: PZ1608U101-1R0TF; Package Size: 0603; JLCPCB Basic Part: No; JLCPCB Part Number: C370064; Supplier 1: LCSC; Category: Ferrite Beads; Supplier Part Number 1: C370064; Tolerance: ±25%; Rated Current: 1A; RoHS: Yes; ComponentLink1Description: Datasheet; ComponentLink1URL: https://wmsc.lcsc.com/wmsc/upload/file/pdf/v2/lcsc/2310301641_Sunlord-PZ1608U101-1R0TF_C370064.pdf; ComponentLink2Description: JLCPCB Part URL; ComponentLink2URL: https://jlcpcb.com/partdetail/C370064; ComponentLink3Description: LCSC Part URL; ComponentLink3URL: https://lcsc.com/product-detail/Ferrite-Beads_Sunlord-Sunlord-PZ1608U101-1R0TF_C370064.html
pins: 1, 2

## PZ1608U101-2R0TF
designator FB?  Impedance @ Frequency: 100Ω@100MHz
Ferrite, 100Ω@100MHz, ±25%, 2A, SMD 0603; Manufacturer: Sunlord; Manufacturer Part Number: PZ1608U101-2R0TF; Package Size: 0603; JLCPCB Basic Part: No; JLCPCB Part Number: C370065; Supplier 1: LCSC; Category: Ferrite Beads; Supplier Part Number 1: C370065; Tolerance: ±25%; Rated Current: 2A; RoHS: Yes; ComponentLink1Description: Datasheet; ComponentLink1URL: https://wmsc.lcsc.com/wmsc/upload/file/pdf/v2/lcsc/2310301641_Sunlord-PZ1608U101-2R0TF_C370065.pdf; ComponentLink2Description: JLCPCB Part URL; ComponentLink2URL: https://jlcpcb.com/partdetail/C370065; ComponentLink3Description: LCSC Part URL; ComponentLink3URL: https://lcsc.com/product-detail/Ferrite-Beads_Sunlord-Sunlord-PZ1608U101-2R0TF_C370065.html
pins: 1, 2

## PZ1608U121-1R0TF
designator FB?  Impedance @ Frequency: 120Ω@100MHz
Ferrite, 120Ω@100MHz, ±25%, 1A, SMD 0603; Manufacturer: Sunlord; Manufacturer Part Number: PZ1608U121-1R0TF; Package Size: 0603; JLCPCB Basic Part: No; JLCPCB Part Number: C370066; Supplier 1: LCSC; Category: Ferrite Beads; Supplier Part Number 1: C370066; Tolerance: ±25%; Rated Current: 1A; RoHS: Yes; ComponentLink1Description: Datasheet; ComponentLink1URL: https://wmsc.lcsc.com/wmsc/upload/file/pdf/v2/lcsc/2310301641_Sunlord-PZ1608U121-1R0TF_C370066.pdf; ComponentLink2Description: JLCPCB Part URL; ComponentLink2URL: https://jlcpcb.com/partdetail/C370066; ComponentLink3Description: LCSC Part URL; ComponentLink3URL: https://lcsc.com/product-detail/Ferrite-Beads_Sunlord-Sunlord-PZ1608U121-1R0TF_C370066.html
pins: 1, 2

## PZ1608U121-1R5TF
designator FB?  Impedance @ Frequency: 120Ω@100MHz
Ferrite, 120Ω@100MHz, ±25%, 1.5A, SMD 0603; Manufacturer: Sunlord; Manufacturer Part Number: PZ1608U121-1R5TF; Package Size: 0603; JLCPCB Basic Part: No; JLCPCB Part Number: C279868; Supplier 1: LCSC; Category: Ferrite Beads; Supplier Part Number 1: C279868; Tolerance: ±25%; Rated Current: 1.5A; RoHS: Yes; ComponentLink1Description: Datasheet; ComponentLink1URL: https://wmsc.lcsc.com/wmsc/upload/file/pdf/v2/lcsc/2310301641_Sunlord-PZ1608U121-1R5TF_C279868.pdf; ComponentLink2Description: JLCPCB Part URL; ComponentLink2URL: https://jlcpcb.com/partdetail/C279868; ComponentLink3Description: LCSC Part URL; ComponentLink3URL: https://lcsc.com/product-detail/Ferrite-Beads_Sunlord-Sunlord-PZ1608U121-1R5TF_C279868.html
pins: 1, 2

## PZ1608U121-2R0TF
designator FB?  Impedance @ Frequency: 120Ω@100MHz
Ferrite, 120Ω@100MHz, ±25%, 0.05Ω, 2000mA, SMD 0603; Manufacturer: Sunlord; Manufacturer Part Number: PZ1608U121-2R0TF; Package Size: 0603; JLCPCB Basic Part: No; JLCPCB Part Number: C304464; Supplier 1: LCSC; Category: Ferrite Beads; Supplier Part Number 1: C304464; Tolerance: ±25%; Rated Current: 2000mA; DC Resistance: 0.05Ω; RoHS: Yes; ComponentLink1Description: Datasheet; ComponentLink1URL: https://wmsc.lcsc.com/wmsc/upload/file/pdf/v2/lcsc/2310301641_Sunlord-PZ1608U121-2R0TF_C304464.pdf; ComponentLink2Description: JLCPCB Part URL; ComponentLink2URL: https://jlcpcb.com/partdetail/C304464; ComponentLink3Description: LCSC Part URL; ComponentLink3URL: https://lcsc.com/product-detail/Ferrite-Beads_Sunlord-Sunlord-PZ1608U121-2R0TF_C304464.html
footprint FB-0603 (0603 (1608M) Ferrite)
pins: 1, 2

## PZ1608U181-1R5TF
designator FB?  Impedance @ Frequency: 180Ω@100MHz
Ferrite, 180Ω@100MHz, ±25%, 1.5A, SMD 0603; Manufacturer: Sunlord; Manufacturer Part Number: PZ1608U181-1R5TF; Package Size: 0603; JLCPCB Basic Part: No; JLCPCB Part Number: C279755; Supplier 1: LCSC; Category: Ferrite Beads; Supplier Part Number 1: C279755; Tolerance: ±25%; Rated Current: 1.5A; RoHS: Yes; ComponentLink1Description: Datasheet; ComponentLink1URL: https://wmsc.lcsc.com/wmsc/upload/file/pdf/v2/lcsc/2310301641_Sunlord-PZ1608U181-1R5TF_C279755.pdf; ComponentLink2Description: JLCPCB Part URL; ComponentLink2URL: https://jlcpcb.com/partdetail/C279755; ComponentLink3Description: LCSC Part URL; ComponentLink3URL: https://lcsc.com/product-detail/Ferrite-Beads_Sunlord-Sunlord-PZ1608U181-1R5TF_C279755.html
pins: 1, 2

## PZ1608U221-1R4TF
designator FB?  Impedance @ Frequency: 220Ω@100MHz
Ferrite, 220Ω@100MHz, ±25%, 0.1Ω, 1400mA, SMD 0603; Manufacturer: Sunlord; Manufacturer Part Number: PZ1608U221-1R4TF; Package Size: 0603; JLCPCB Basic Part: No; JLCPCB Part Number: C74333; Supplier 1: LCSC; Category: Ferrite Beads; Supplier Part Number 1: C74333; Tolerance: ±25%; Rated Current: 1400mA; DC Resistance: 0.1Ω; RoHS: Yes; ComponentLink1Description: Datasheet; ComponentLink1URL: https://wmsc.lcsc.com/wmsc/upload/file/pdf/v2/lcsc/2310301641_Sunlord-PZ1608U221-1R4TF_C74333.pdf; ComponentLink2Description: JLCPCB Part URL; ComponentLink2URL: https://jlcpcb.com/partdetail/C74333; ComponentLink3Description: LCSC Part URL; ComponentLink3URL: https://lcsc.com/product-detail/Ferrite-Beads_Sunlord-Sunlord-PZ1608U221-1R4TF_C74333.html
footprint FB-0603 (0603 (1608M) Ferrite)
pins: 1, 2

## PZ1608U300-3R0TF
designator FB?  Impedance @ Frequency: 30Ω@100MHz
Ferrite, 30Ω@100MHz, ±25%, 0.03Ω, 3000mA, SMD 0603; Manufacturer: Sunlord; Manufacturer Part Number: PZ1608U300-3R0TF; Package Size: 0603; JLCPCB Basic Part: No; JLCPCB Part Number: C279766; Supplier 1: LCSC; Category: Ferrite Beads; Supplier Part Number 1: C279766; Tolerance: ±25%; Rated Current: 3000mA; DC Resistance: 0.03Ω; RoHS: Yes; ComponentLink1Description: Datasheet; ComponentLink1URL: https://wmsc.lcsc.com/wmsc/upload/file/pdf/v2/lcsc/2310301641_Sunlord-PZ1608U300-3R0TF_C279766.pdf; ComponentLink2Description: JLCPCB Part URL; ComponentLink2URL: https://jlcpcb.com/partdetail/C279766; ComponentLink3Description: LCSC Part URL; ComponentLink3URL: https://lcsc.com/product-detail/Ferrite-Beads_Sunlord-Sunlord-PZ1608U300-3R0TF_C279766.html
footprint FB-0603 (0603 (1608M) Ferrite)
pins: 1, 2

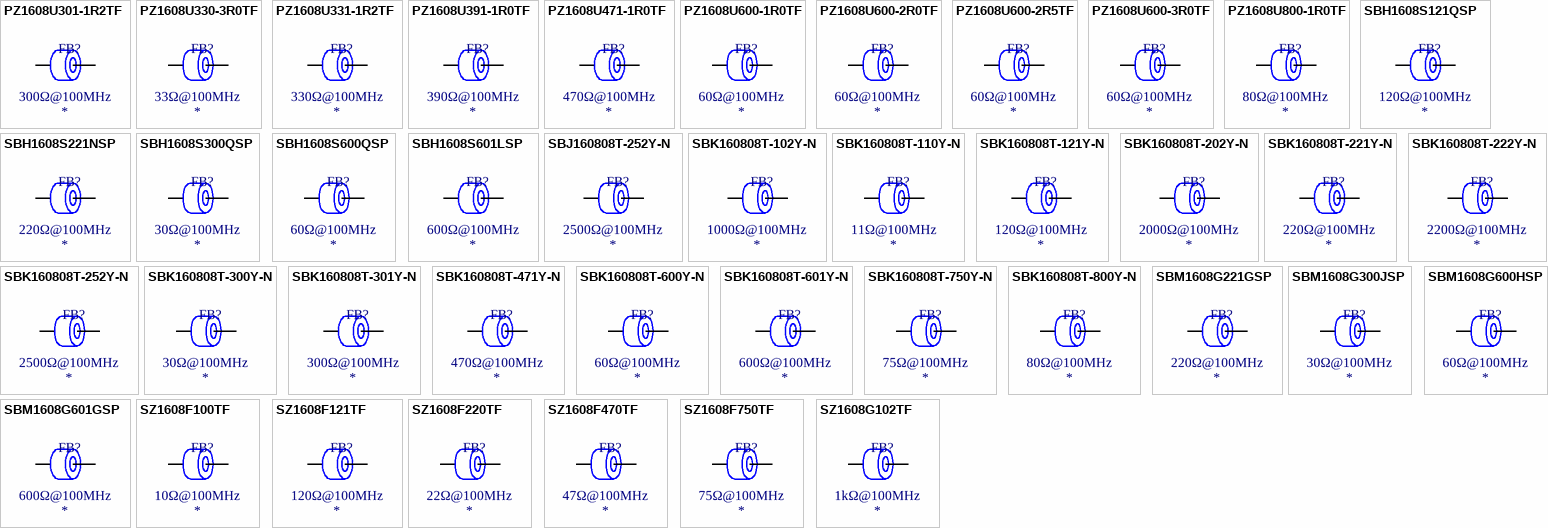
[diagram p18: symbols PZ1608U301-1R2TF to SZ1608G102TF]

## PZ1608U301-1R2TF
designator FB?  Impedance @ Frequency: 300Ω@100MHz
Ferrite, 300Ω@100MHz, ±25%, 1.2A, SMD 0603; Manufacturer: Sunlord; Manufacturer Part Number: PZ1608U301-1R2TF; Package Size: 0603; JLCPCB Basic Part: No; JLCPCB Part Number: C304465; Supplier 1: LCSC; Category: Ferrite Beads; Supplier Part Number 1: C304465; Tolerance: ±25%; Rated Current: 1.2A; RoHS: Yes; ComponentLink1Description: Datasheet; ComponentLink1URL: https://wmsc.lcsc.com/wmsc/upload/file/pdf/v2/lcsc/2310301641_Sunlord-PZ1608U301-1R2TF_C304465.pdf; ComponentLink2Description: JLCPCB Part URL; ComponentLink2URL: https://jlcpcb.com/partdetail/C304465; ComponentLink3Description: LCSC Part URL; ComponentLink3URL: https://lcsc.com/product-detail/Ferrite-Beads_Sunlord-Sunlord-PZ1608U301-1R2TF_C304465.html
pins: 1, 2

## PZ1608U330-3R0TF
designator FB?  Impedance @ Frequency: 33Ω@100MHz
Ferrite, 33Ω@100MHz, ±25%, 3A, SMD 0603; Manufacturer: Sunlord; Manufacturer Part Number: PZ1608U330-3R0TF; Package Size: 0603; JLCPCB Basic Part: No; JLCPCB Part Number: C279929; Supplier 1: LCSC; Category: Ferrite Beads; Supplier Part Number 1: C279929; Tolerance: ±25%; Rated Current: 3A; RoHS: Yes; ComponentLink1Description: Datasheet; ComponentLink1URL: https://wmsc.lcsc.com/wmsc/upload/file/pdf/v2/lcsc/2310301641_Sunlord-PZ1608U330-3R0TF_C279929.pdf; ComponentLink2Description: JLCPCB Part URL; ComponentLink2URL: https://jlcpcb.com/partdetail/C279929; ComponentLink3Description: LCSC Part URL; ComponentLink3URL: https://lcsc.com/product-detail/Ferrite-Beads_Sunlord-Sunlord-PZ1608U330-3R0TF_C279929.html
pins: 1, 2
